# Altium footprint library ST封装.PcbLib: 1336 footprints (part 93 of 109)
Each footprint in its own frame and in the unit in brackets; x right, y up, seen from the top. Pads: shape width x height; smd on the part's side, far side on the other; paste and mask are expansions set on the pad; w line width, h text height; cw(c..) or ccw(c..) is an arc to the next point about the centre after c.
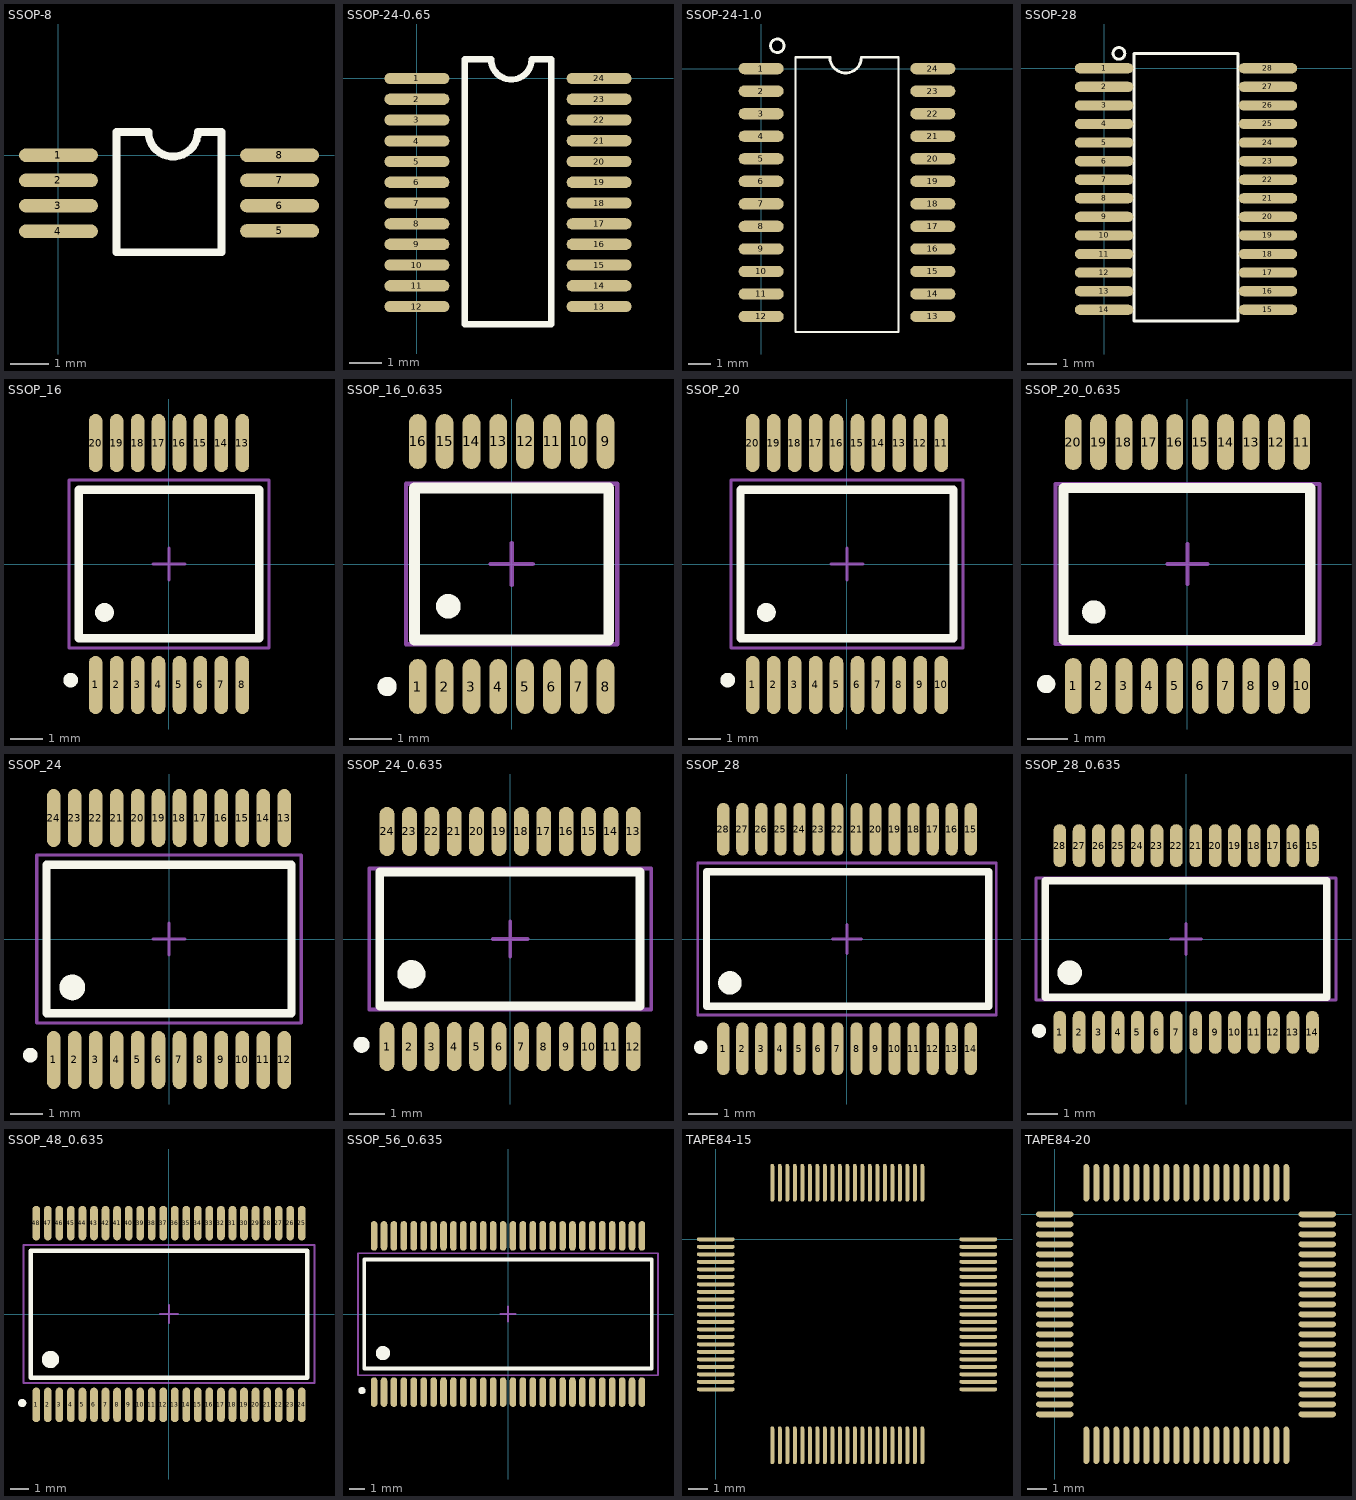
[diagram p92: the footprints below, top view; thin cyan lines are the x and y axes]

## SSOP-8 [mm]
pads (8):
  oval 2.032x0.35 smd: 1(0,0) 2(0,-0.65) 3(0,-1.3) 4(0,-1.96) 5(5.7,-1.95) 6(5.7,-1.3) 7(5.7,-0.65) 8(5.7,0)
Top Overlay:
  lines w0.2: 1.5,-2.5 4.2,-2.5 4.2,0.6 3.59,0.6 cw(c2.955,0.6) 2.32,0.6 1.5,0.6 1.5,-2.5

## SSOP-24-0.65 [mm]
pads (24):
  oval 2.032x0.35 smd: 1(0,0) 2(0,-0.65) 3(0,-1.3) 4(0,-1.96) 5(0,-2.6) 6(0,-3.25) 7(0,-3.9) 8(0,-4.55) 9(0,-5.19) 10(0,-5.84) 11(0,-6.49) 12(0,-7.14) 13(5.7,-7.14) 14(5.7,-6.49) 15(5.7,-5.84) 16(5.7,-5.19) 17(5.7,-4.55) 18(5.7,-3.9) 19(5.7,-3.25) 20(5.7,-2.6) 21(5.7,-1.95) 22(5.7,-1.3) 23(5.7,-0.65) 24(5.7,0)
Top Overlay:
  lines w0.2: 1.5,-7.7 1.5,0.6 2.32,0.6 ccw(c2.955,0.6) 3.59,0.6 4.2,0.6 4.2,-7.7 1.5,-7.7

## SSOP-24-1.0 [mm]
pads (24):
  oval 2x0.5 smd: 1(0,0) 2(0,-1) 3(0,-2) 4(0,-3) 5(0,-4) 6(0,-5) 7(0,-6) 8(0,-7) 9(0,-8) 10(0,-9) 11(0,-10) 12(0,-11) 13(7.62,-11) 14(7.62,-10) 15(7.62,-9) 16(7.62,-8) 17(7.62,-7) 18(7.62,-6) 19(7.62,-5) 20(7.62,-4) 21(7.62,-3) 22(7.62,-2) 23(7.62,-1) 24(7.62,0)
Top Overlay:
  circle w0.127: c0.716,1.016 r0.3
  lines w0.1: 3.048,0.508 1.524,0.508 1.524,-11.684 6.096,-11.684 6.096,0.508 4.448,0.508
  lines w0.127: 3.048,0.508 ccw(c3.748,0.508) 4.448,0.508

## SSOP-28 [mm]
pads (28):
  oval 2x0.35 smd: 1(0,0) 2(0,-0.635) 3(0,-1.27) 4(0,-1.905) 5(0,-2.54) 6(0,-3.175) 7(0,-3.81) 8(0,-4.445) 9(0,-5.08) 10(0,-5.715) 11(0,-6.35) 12(0,-6.985) 13(0,-7.62) 14(0,-8.255) 15(5.6,-8.255) 16(5.6,-7.62) 17(5.6,-6.985) 18(5.6,-6.35) 19(5.6,-5.715) 20(5.6,-5.08) 21(5.6,-4.445) 22(5.6,-3.81) 23(5.6,-3.175) 24(5.6,-2.54) 25(5.6,-1.905) 26(5.6,-1.27) 27(5.6,-0.635) 28(5.6,0)
Top Overlay:
  lines w0.1: 0.708,0.508 cw(c0.508,0.508) 0.708,0.511 ; 1.016,-8.636 4.572,-8.636 4.572,0.508 1.016,0.508 1.016,-8.636

## SSOP_16 [mm] "0.65"
pads (16):
  oval 0.42x1.8 smd: 1(-2.275,-3.75) 2(-1.625,-3.75) 3(-0.975,-3.75) 4(-0.325,-3.75) 5(0.325,-3.75) 6(0.975,-3.75) 7(1.625,-3.75) 8(2.275,-3.75) 13(2.275,3.75) 14(1.625,3.75) 15(0.975,3.75) 16(0.325,3.75) 17(-0.325,3.75) 18(-0.975,3.75) 19(-1.625,3.75) 20(-2.275,3.75)
Top Overlay:
  circle w0.254: c-3.05,-3.6 r0.1
  circle w0.3: c-2,-1.5 r0.141
  lines w0.254: -2.8,-2.3 -2.8,2.3 2.8,2.3 2.8,-2.3 -2.8,-2.3
Mechanical 15:
  lines w0.1: -0.5,0 0.5,0 ; 0,-0.5 0,0.5 ; -3.1,-2.6 3.1,-2.6 3.1,2.6 -3.1,2.6 -3.1,-2.6
3D body "SSOP-16.STEP": height 1.9, standoff 0, extent -3.1,-3.9 3.1,3.9

## SSOP_16_0.635 [mm]
pads (16):
  oval 0.42x1.3 smd: 1(-2.222,-2.9) 2(-1.587,-2.9) 3(-0.953,-2.9) 4(-0.318,-2.9) 5(0.318,-2.9) 6(0.953,-2.9) 7(1.587,-2.9) 8(2.222,-2.9) 9(2.222,2.9) 10(1.587,2.9) 11(0.953,2.9) 12(0.318,2.9) 13(-0.318,2.9) 14(-0.953,2.9) 15(-1.587,2.9) 16(-2.222,2.9)
Top Overlay:
  circle w0.254: c-2.947,-2.9 r0.1
  circle w0.3: c-1.5,-1 r0.141
  lines w0.254: -2.3,-1.8 2.3,-1.8 2.3,1.8 -2.3,1.8 -2.3,-1.8
Mechanical 15:
  lines w0.1: -0.5,0 0.5,0 ; 0,-0.5 0,0.5 ; -2.5,-1.9 2.5,-1.9 2.5,1.9 -2.5,1.9 -2.5,-1.9
3D body "SSOP-16-0.635.STEP": height 1.1, standoff 0, extent -2.512,-3 2.467,2.994

## SSOP_20 [mm] "0.65"
pads (20):
  oval 0.42x1.8 smd: 1(-2.925,-3.75) 2(-2.275,-3.75) 3(-1.625,-3.75) 4(-0.975,-3.75) 5(-0.325,-3.75) 6(0.325,-3.75) 7(0.975,-3.75) 8(1.625,-3.75) 9(2.275,-3.75) 10(2.925,-3.75) 11(2.925,3.75) 12(2.275,3.75) 13(1.625,3.75) 14(0.975,3.75) 15(0.325,3.75) 16(-0.325,3.75) 17(-0.975,3.75) 18(-1.625,3.75) 19(-2.275,3.75) 20(-2.925,3.75)
Top Overlay:
  circle w0.3: c-2.5,-1.5 r0.141
  circle w0.254: c-3.7,-3.6 r0.1
  lines w0.254: -3.3,-2.3 -3.3,2.3 3.3,2.3 3.3,-2.3 -3.3,-2.3
Mechanical 15:
  lines w0.1: -0.5,0 0.5,0 ; 0,-0.5 0,0.5 ; -3.6,-2.6 3.6,-2.6 3.6,2.6 -3.6,2.6 -3.6,-2.6
3D body "SSOP-20.STEP": height 1.9, standoff 0, extent -3.6,-3.9 3.6,3.9

## SSOP_20_0.635 [mm]
pads (20):
  oval 0.42x1.4 smd: 1(-2.857,-3.05) 2(-2.222,-3.05) 3(-1.587,-3.05) 4(-0.953,-3.05) 5(-0.318,-3.05) 6(0.318,-3.05) 7(0.953,-3.05) 8(1.587,-3.05) 9(2.222,-3.05) 10(2.857,-3.05) 11(2.857,3.05) 12(2.222,3.05) 13(1.587,3.05) 14(0.953,3.05) 15(0.318,3.05) 16(-0.318,3.05) 17(-0.953,3.05) 18(-1.587,3.05) 19(-2.222,3.05) 20(-2.857,3.05)
Top Overlay:
  circle w0.3: c-2.341,-1.2 r0.141
  circle w0.254: c-3.532,-3 r0.1
  lines w0.254: -3.1,-1.9 3.067,-1.9 3.067,1.9 -3.1,1.9 -3.1,-1.9
Mechanical 15:
  lines w0.1: -0.5,0 0.5,0 ; 0,-0.5 0,0.5 ; -3.3,-2 3.3,-2 3.3,2 -3.3,2 -3.3,-2
3D body "TSSOP-20.STEP": height 1.2, standoff 0, extent -3.25,-3.2 3.25,3.2

## SSOP_24 [mm] "0.65"
pads (24):
  oval 0.42x1.8 smd: 1(-3.575,-3.75) 2(-2.925,-3.75) 3(-2.275,-3.75) 4(-1.625,-3.75) 5(-0.975,-3.75) 6(-0.325,-3.75) 7(0.325,-3.75) 8(0.975,-3.75) 9(1.625,-3.75) 10(2.275,-3.75) 11(2.925,-3.75) 12(3.575,-3.75) 13(3.575,3.75) 14(2.925,3.75) 15(2.275,3.75) 16(1.625,3.75) 17(0.975,3.75) 18(0.325,3.75) 19(-0.325,3.75) 20(-0.975,3.75) 21(-1.625,3.75) 22(-2.275,3.75) 23(-2.925,3.75) 24(-3.575,3.75)
Top Overlay:
  circle w0.4: c-3,-1.5 r0.2
  circle w0.254: c-4.3,-3.6 r0.1
  lines w0.254: -3.8,-2.3 -3.8,2.3 3.8,2.3 3.8,-2.3 -3.8,-2.3
Mechanical 15:
  lines w0.1: -0.5,0 0.5,0 ; 0,-0.5 0,0.5 ; -4.1,-2.6 -4.1,2.6 4.1,2.6 4.1,-2.6 -4.1,-2.6
3D body "SSOP-24.STEP": height 1.9, standoff 0, extent -4.1,-3.9 4.1,3.9

## SSOP_24_0.635 [mm]
pads (24):
  oval 0.42x1.4 smd: 1(-3.492,-3.05) 2(-2.857,-3.05) 3(-2.222,-3.05) 4(-1.587,-3.05) 5(-0.952,-3.05) 6(-0.317,-3.05) 7(0.318,-3.05) 8(0.953,-3.05) 9(1.588,-3.05) 10(2.223,-3.05) 11(2.858,-3.05) 12(3.493,-3.05) 13(3.493,3.05) 14(2.858,3.05) 15(2.223,3.05) 16(1.588,3.05) 17(0.953,3.05) 18(0.318,3.05) 19(-0.317,3.05) 20(-0.952,3.05) 21(-1.587,3.05) 22(-2.222,3.05) 23(-2.857,3.05) 24(-3.492,3.05)
Top Overlay:
  circle w0.4: c-2.8,-1 r0.2
  circle w0.254: c-4.217,-3 r0.1
  lines w0.254: -3.7,-1.9 3.683,-1.9 3.683,1.9 -3.7,1.9 -3.7,-1.9
Mechanical 15:
  lines w0.1: -0.5,0 0.5,0 ; 0,-0.5 0,0.5 ; -4,-2 4,-2 4,2 -4,2 -4,-2
3D body "TSSOP-24.STEP": height 1.2, standoff 0, extent -3.9,-3.2 3.9,3.2

## SSOP_28 [mm] "0.65"
pads (28):
  oval 0.42x1.8 smd: 1(-4.225,-3.75) 2(-3.575,-3.75) 3(-2.925,-3.75) 4(-2.275,-3.75) 5(-1.625,-3.75) 6(-0.975,-3.75) 7(-0.325,-3.75) 8(0.325,-3.75) 9(0.975,-3.75) 10(1.625,-3.75) 11(2.275,-3.75) 12(2.925,-3.75) 13(3.575,-3.75) 14(4.225,-3.75) 15(4.225,3.75) 16(3.575,3.75) 17(2.925,3.75) 18(2.275,3.75) 19(1.625,3.75) 20(0.975,3.75) 21(0.325,3.75) 22(-0.325,3.75) 23(-0.975,3.75) 24(-1.625,3.75) 25(-2.275,3.75) 26(-2.925,3.75) 27(-3.575,3.75) 28(-4.225,3.75)
Top Overlay:
  circle w0.254: c-5,-3.7 r0.1
  circle w0.4: c-4,-1.5 r0.2
  lines w0.254: -4.8,-2.3 4.842,-2.3 4.842,2.3 -4.8,2.3 -4.8,-2.3
Mechanical 15:
  lines w0.1: -0.5,0 0.5,0 ; 0,-0.5 0,0.5 ; -5.1,-2.6 5.1,-2.6 5.1,2.6 -5.1,2.6 -5.1,-2.6
3D body "User Library-SSOP-28-3.STEP": height 1.9, standoff 0, extent -5.1,-3.9 5.1,3.9

## SSOP_28_0.635 [mm]
pads (28):
  oval 0.42x1.4 smd: 1(-4.127,-3.05) 2(-3.492,-3.05) 3(-2.857,-3.05) 4(-2.222,-3.05) 5(-1.587,-3.05) 6(-0.953,-3.05) 7(-0.318,-3.05) 8(0.318,-3.05) 9(0.953,-3.05) 10(1.587,-3.05) 11(2.222,-3.05) 12(2.857,-3.05) 13(3.492,-3.05) 14(4.127,-3.05) 15(4.127,3.05) 16(3.492,3.05) 17(2.857,3.05) 18(2.222,3.05) 19(1.587,3.05) 20(0.953,3.05) 21(0.318,3.05) 22(-0.318,3.05) 23(-0.953,3.05) 24(-1.587,3.05) 25(-2.222,3.05) 26(-2.857,3.05) 27(-3.492,3.05) 28(-4.127,3.05)
Top Overlay:
  circle w0.254: c-4.802,-3 r0.1
  circle w0.4: c-3.8,-1.1 r0.2
  lines w0.254: -4.6,-1.9 -4.6,1.9 4.598,1.9 4.598,-1.9 -4.6,-1.9
Mechanical 15:
  lines w0.1: -0.5,0 0.5,0 ; 0,-0.5 0,0.5 ; -4.9,-2 -4.9,2 4.9,2 4.9,-2 -4.9,-2
3D body "TSSOP-28.STEP": height 1.2, standoff 0, extent -4.85,-3.2 4.85,3.2

## SSOP_48_0.635 [mm] "0.635"
pads (48):
  oval 0.42x1.9 smd: 1(-7.302,-5) 2(-6.667,-5) 3(-6.032,-5) 4(-5.397,-5) 5(-4.762,-5) 6(-4.127,-5) 7(-3.492,-5) 8(-2.857,-5) 9(-2.222,-5) 10(-1.587,-5) 11(-0.952,-5) 12(-0.317,-5) 13(0.318,-5) 14(0.953,-5) 15(1.588,-5) 16(2.223,-5) 17(2.858,-5) 18(3.493,-5) 19(4.128,-5) 20(4.763,-5) 21(5.398,-5) 22(6.033,-5) 23(6.668,-5) 24(7.303,-5) 25(7.303,5) 26(6.668,5) 27(6.033,5) 28(5.398,5) 29(4.763,5) 30(4.128,5) 31(3.493,5) 32(2.858,5) 33(2.223,5) 34(1.588,5) 35(0.953,5) 36(0.318,5) 37(-0.317,5) 38(-0.952,5) 39(-1.587,5) 40(-2.222,5) 41(-2.857,5) 42(-3.492,5) 43(-4.127,5) 44(-4.762,5) 45(-5.397,5) 46(-6.032,5) 47(-6.667,5) 48(-7.302,5)
Top Overlay:
  circle w0.5: c-6.524,-2.5 r0.224
  circle w0.254: c-8.077,-4.9 r0.1
  lines w0.254: -7.6,-3.5 -7.6,3.475 7.6,3.475 7.6,-3.5 -7.6,-3.5
Mechanical 15:
  lines w0.1: -0.5,0 0.5,0 ; 0,-0.5 0,0.5 ; -8,-3.8 -8,3.8 8,3.8 8,-3.8 -8,-3.8
3D body "User Library-SSOP-48.step": height 2.65, standoff 0, extent -8.002,-5.15 7.998,5.25

## SSOP_56_0.635 [mm] "0.635"
pads (56):
  oval 0.42x1.9 smd: 1(-8.572,-5) 2(-7.937,-5) 3(-7.302,-5) 4(-6.667,-5) 5(-6.032,-5) 6(-5.397,-5) 7(-4.762,-5) 8(-4.127,-5) 9(-3.492,-5) 10(-2.857,-5) 11(-2.222,-5) 12(-1.587,-5) 13(-0.952,-5) 14(-0.317,-5) 15(0.318,-5) 16(0.953,-5) 17(1.588,-5) 18(2.223,-5) 19(2.858,-5) 20(3.493,-5) 21(4.128,-5) 22(4.763,-5) 23(5.398,-5) 24(6.033,-5) 25(6.668,-5) 26(7.303,-5) 27(7.938,-5) 28(8.573,-5) 29(8.573,5) 30(7.938,5) 31(7.303,5) 32(6.668,5) 33(6.033,5) 34(5.398,5) 35(4.763,5) 36(4.128,5) 37(3.493,5) 38(2.858,5) 39(2.223,5) 40(1.588,5) 41(0.953,5) 42(0.318,5) 43(-0.317,5) 44(-0.952,5) 45(-1.587,5) 46(-2.222,5) 47(-2.857,5) 48(-3.492,5) 49(-4.127,5) 50(-4.762,5) 51(-5.397,5) 52(-6.032,5) 53(-6.667,5) 54(-7.302,5) 55(-7.937,5) 56(-8.572,5)
Top Overlay:
  circle w0.5: c-8,-2.5 r0.2
  circle w0.254: c-9.347,-4.9 r0.1
  lines w0.254: -9.2,-3.5 -9.2,3.475 9.2,3.475 9.2,-3.5 -9.2,-3.5
Mechanical 15:
  lines w0.1: -0.5,0 0.5,0 ; 0,-0.5 0,0.5 ; -9.6,-3.925 -9.6,3.875 9.6,3.875 9.6,-3.925 -9.6,-3.925
3D body "User Library-SSOP56_CY7C68013A.step": height 2.77, standoff 0, extent -9.272,-5.3 9.271,5.348

## TAPE84-15 [mil]
pads (84):
  oval 75x8 smd: 1(0,0) 2(0,-15) 3(0,-30) 4(0,-45) 5(0,-60) 6(0,-75) 7(0,-90) 8(0,-105) 9(0,-120) 10(0,-135) 11(0,-150) 12(0,-165) 13(0,-180) 14(0,-195) 15(0,-210) 16(0,-225) 17(0,-240) 18(0,-255) 19(0,-270) 20(0,-285) 21(0,-300) 43(525,-300) 44(525,-285) 45(525,-270) 46(525,-255) 47(525,-240) 48(525,-225) 49(525,-210) 50(525,-195) 51(525,-180) 52(525,-165) 53(525,-150) 54(525,-135) 55(525,-120) 56(525,-105) 57(525,-90) 58(525,-75) 59(525,-60) 60(525,-45) 61(525,-30) 62(525,-15) 63(525,0)
  oval 8x75 smd: 22(113,-412) 23(128,-412) 24(143,-412) 25(158,-412) 26(173,-412) 27(188,-412) 28(203,-412) 29(218,-412) 30(233,-412) 31(248,-412) 32(263,-412) 33(278,-412) 34(293,-412) 35(308,-412) 36(323,-412) 37(338,-412) 38(353,-412) 39(368,-412) 40(383,-412) 41(398,-412) 42(413,-412) 64(413,113) 65(398,113) 66(383,113) 67(368,113) 68(353,113) 69(338,113) 70(323,113) 71(308,113) 72(293,113) 73(278,113) 74(263,113) 75(248,113) 76(233,113) 77(218,113) 78(203,113) 79(188,113) 80(173,113) 81(158,113) 82(143,113) 83(128,113) 84(113,113)

## TAPE84-20 [mil]
pads (84):
  oval 75x12 smd: 1(0,0) 2(0,-20) 3(0,-40) 4(0,-60) 5(0,-80) 6(0,-100) 7(0,-120) 8(0,-140) 9(0,-160) 10(0,-180) 11(0,-200) 12(0,-220) 13(0,-240) 14(0,-260) 15(0,-280) 16(0,-300) 17(0,-320) 18(0,-340) 19(0,-360) 20(0,-380) 21(0,-400) 43(525,-400) 44(525,-380) 45(525,-360) 46(525,-340) 47(525,-320) 48(525,-300) 49(525,-280) 50(525,-260) 51(525,-240) 52(525,-220) 53(525,-200) 54(525,-180) 55(525,-160) 56(525,-140) 57(525,-120) 58(525,-100) 59(525,-80) 60(525,-60) 61(525,-40) 62(525,-20) 63(525,0)
  oval 12x75 smd: 22(63,-462) 23(83,-462) 24(103,-462) 25(123,-462) 26(143,-462) 27(163,-462) 28(183,-462) 29(203,-462) 30(223,-462) 31(243,-462) 32(263,-462) 33(283,-462) 34(303,-462) 35(323,-462) 36(343,-462) 37(363,-462) 38(383,-462) 39(403,-462) 40(423,-462) 41(443,-462) 42(463,-462) 64(463,63) 65(443,63) 66(423,63) 67(403,63) 68(383,63) 69(363,63) 70(343,63) 71(323,63) 72(303,63) 73(283,63) 74(263,63) 75(243,63) 76(223,63) 77(203,63) 78(183,63) 79(163,63) 80(143,63) 81(123,63) 82(103,63) 83(83,63) 84(63,63)